# Altium footprint library Разъемы.PcbLib: 291 footprints (part 4 of 19)
Each footprint in its own frame and in the unit in brackets; x right, y up, seen from the top. Pads: shape width x height; smd on the part's side, far side on the other; paste and mask are expansions set on the pad; w line width, h text height; cw(c..) or ccw(c..) is an arc to the next point about the centre after c.
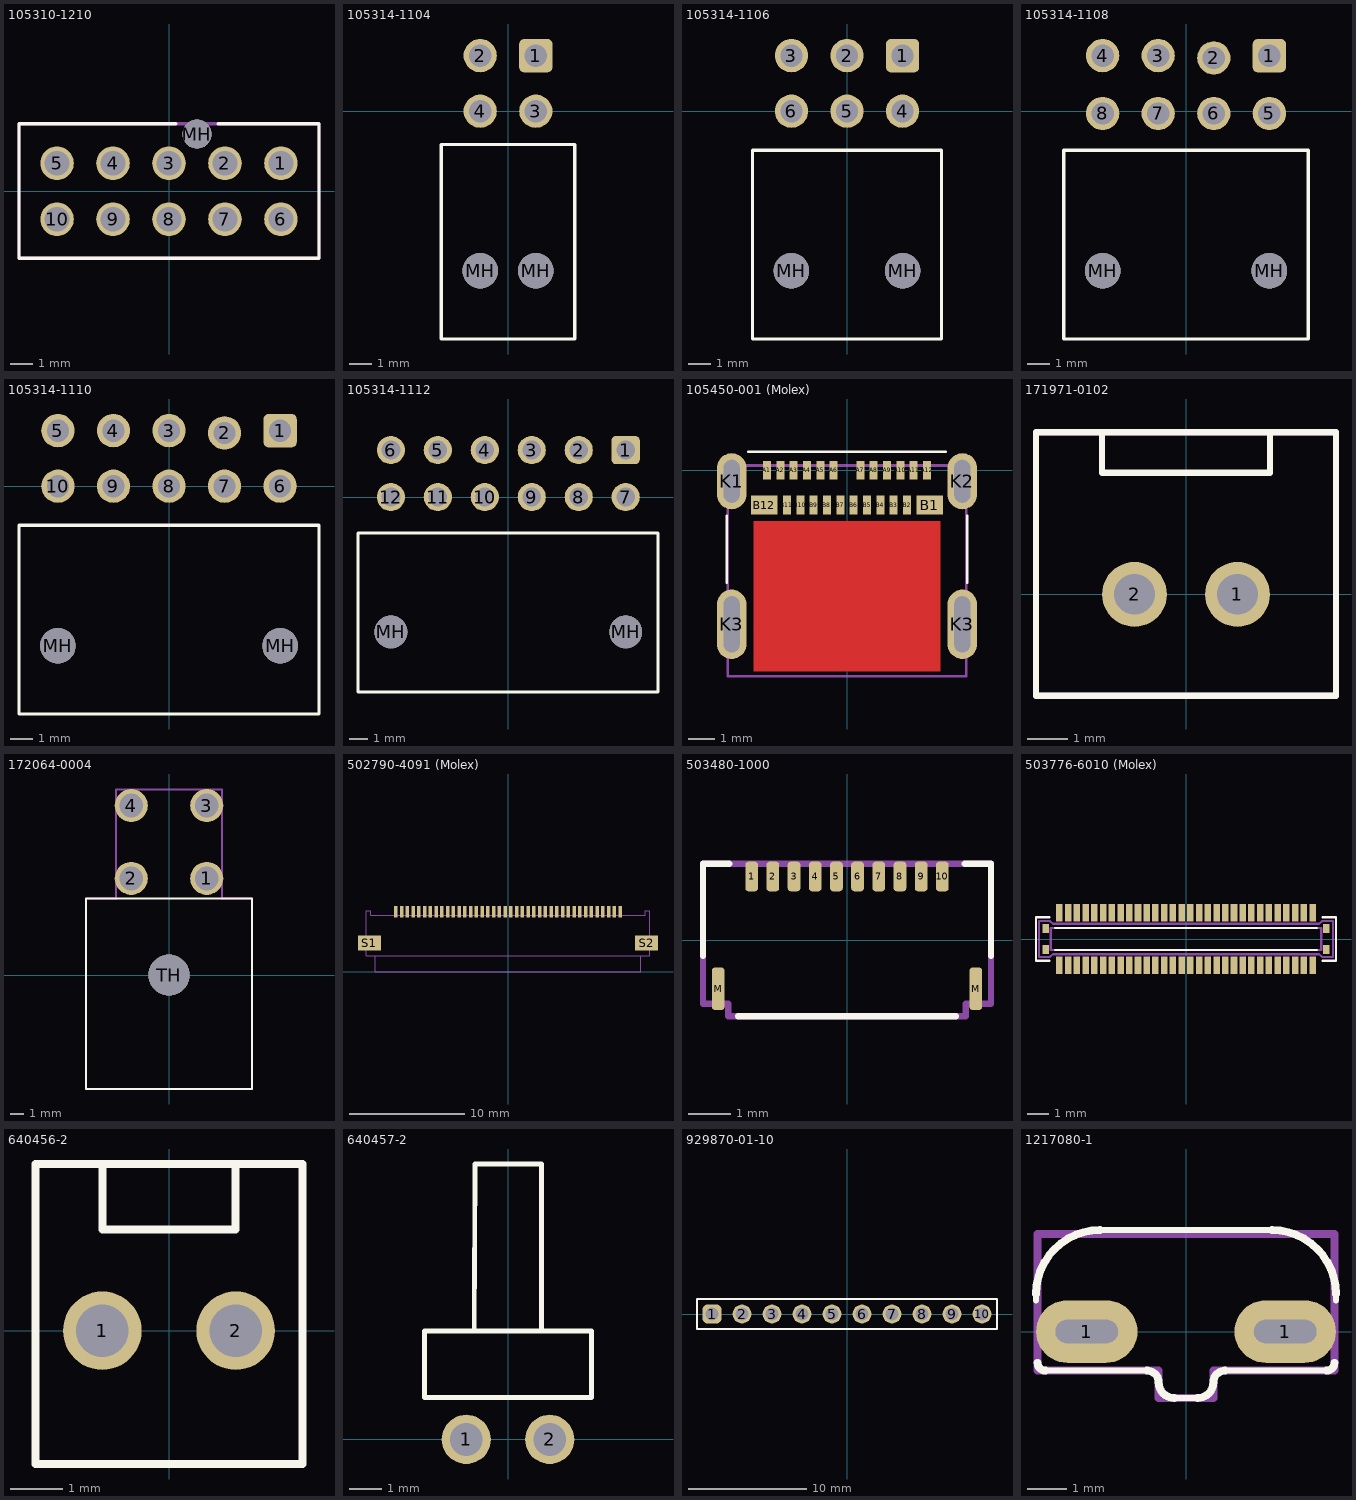
[diagram p3: the footprints below, top view; thin cyan lines are the x and y axes]

## 105310-1210 [mm]
pads (11):
  round 1.5 hole 1.1: 1(5,1.25) 2(2.5,1.25) 3(0,1.25) 4(-2.5,1.25) 5(-5,1.25) 6(5,-1.25) 7(2.5,-1.25) 8(0,-1.25) 9(-2.5,-1.25) 10(-5,-1.25)
  round 1.3 hole 1.3 unplated: MH(1.25,2.55)
Top Overlay:
  lines w0.15: 0.3,3.01 -6.7,3.01 -6.7,-3 6.7,-3 6.7,3.01 2.2,3.01
  text "." at 5.53,3.5 h0.1
Top Courtyard:
  lines w0.15: -6.7,-3 -6.7,3.01 6.7,3.01 6.7,-3 0,-3 -6.7,-3
Top Designator:
  text ".Designator" at -3.999,1.121 h0.8
3D body "1053101110.stp": height 10.68, standoff -3.03, extent -6.72,-2.99 6.72,5.85

## 105314-1104 [mm]
height 9.2
pads (6):
  rrect30% 1.5x1.5 hole 1: 1(1.25,2.5)
  round 1.5 hole 1: 2(-1.25,2.5) 3(1.25,0) 4(-1.25,0)
  round 1.6 hole 1.6 unplated: MH(-1.25,-7.18) MH(1.25,-7.18)
Top Overlay:
  lines w0.15: -3,-10.25 -3,-1.5 0,-1.5 3,-1.5 3,-10.25 -3,-10.25
  text "." at 2,3.75 h0.1
3D body "1053141104.stp": height 9.15, standoff -3.19, extent -2.97,-11.84 2.97,2.818

## 105314-1106 [mm]
height 9.2
pads (8):
  rrect30% 1.5x1.5 hole 1: 1(2.5,2.5)
  round 1.5 hole 1: 2(0,2.5) 3(-2.5,2.5) 4(2.5,0) 5(0,0) 6(-2.5,0)
  round 1.6 hole 1.6 unplated: MH(-2.5,-7.18) MH(2.5,-7.18)
Top Overlay:
  lines w0.15: -4.25,-10.25 4.25,-10.25 4.25,-1.75 -4.25,-1.75 -4.25,-10.25
  text "." at 3.75,3.75 h0.1
3D body "1053141406.stp": height 9.15, standoff -3.19, extent -4.22,-11.84 4.22,2.818

## 105314-1108 [mm]
height 9.2
pads (10):
  rrect30% 1.5x1.5 hole 1: 1(3.75,2.5)
  round 1.5 hole 1: 2(1.25,2.4) 3(-1.25,2.5) 4(-3.75,2.5) 5(3.75,-0.1) 6(1.25,-0.1) 7(-1.25,-0.1) 8(-3.75,-0.1)
  round 1.6 hole 1.6 unplated: MH(-3.75,-7.18) MH(3.75,-7.18)
Top Overlay:
  lines w0.15: -5.5,-10.25 5.5,-10.25 5.5,-1.75 -5.5,-1.75 -5.5,-10.25
  text "." at 5,3.5 h0.1
3D body "1053141108.stp": height 9.25, standoff -3.09, extent -5.47,-11.89 5.47,2.768

## 105314-1110 [mm]
height 9.2
pads (12):
  rrect30% 1.5x1.5 hole 1: 1(5,2.5)
  round 1.5 hole 1: 2(2.5,2.4) 3(0,2.5) 4(-2.5,2.5) 5(-5,2.5) 6(5,0) 7(2.5,0) 8(0,0) 9(-2.5,0) 10(-5,0)
  round 1.6 hole 1.6 unplated: MH(-5,-7.18) MH(5,-7.18)
Top Overlay:
  lines w0.15: -6.75,-10.25 -6.75,-1.75 6.75,-1.75 6.75,-10.25 -6.75,-10.25
  text "." at 6.25,3.5 h0.1
3D body "1053141110.stp": height 9.15, standoff -3.19, extent -6.72,-11.89 6.72,2.768

## 105314-1112 [mm]
pads (14):
  rrect30% 1.5x1.5 hole 1: 1(6.25,2.5)
  round 1.5 hole 1: 2(3.75,2.5) 3(1.25,2.5) 4(-1.25,2.5) 5(-3.75,2.5) 6(-6.25,2.5) 7(6.25,0) 8(3.75,0) 9(1.25,0) 10(-1.25,0) 11(-3.75,0) 12(-6.25,0)
  round 1.75 hole 1.75 unplated: MH(-6.25,-7.18) MH(6.25,-7.18)
Top Overlay:
  lines w0.15: -8,-10.38 7.97,-10.38 7.97,-1.92 -8,-1.92 -8,-10.38
  text "." at 7.5,3.5 h0.1
3D body "1053141112.stp": height 9.35, standoff -2.99, extent -7.97,-11.89 7.97,2.768

## 105450-001 (Molex) [mm] "Type-C"
height 2.56
pads (28):
  rect 0.3x0.7 smd: A1(-3,0) A2(-2.5,0) A3(-2,0) A4(-1.5,0) A5(-1,0) A6(-0.5,0) A7(0.5,0) A8(1,0) A9(1.5,0) A10(2,0) A11(2.5,0) A12(3,0) B2(2.25,-1.3) B3(1.75,-1.3) B4(1.25,-1.3) B5(0.75,-1.3) B6(0.25,-1.3) B7(-0.25,-1.3) B8(-0.75,-1.3) B9(-1.25,-1.3) B10(-1.75,-1.3) B11(-2.25,-1.3)
  rect 1x0.7 smd: B1(3.1,-1.3) B12(-3.1,-1.3)
  oval 1.1x2.1 hole 0.6 slot 1.6 at 90 deg: K1(-4.32,-0.41) K2(4.32,-0.41)
  oval 1.1x2.6 hole 0.6 slot 2.1 at 90 deg: K3(-4.32,-5.77) K3(4.32,-5.77)
Top Layer:
  rectangle: -3.5,-7.54 3.5,-1.89
Top Overlay:
  lines w0.1: -4.5,-4.2 -4.5,-1.7 ; -3.7,0.7 3.7,0.7 ; 4.5,-4.2 4.5,-1.7
Mechanical 1:
  lines w0.1: -4.47,-7.72 -4.47,0.18 4.47,0.18 4.47,-7.72 -4.47,-7.72
3D body "1054500 - 101 (Molex).STEP": height 3.17, standoff -0.79, extent -4.47,-7.72 4.47,0.18

## 171971-0102 [mm]
height 12
pads (2):
  round 1.6 hole 1: 1(1.27,0) 2(-1.27,0)
Top Overlay:
  lines w0.15: -1.011,4 -2.07,4 -2.07,3 0,3 2.07,3 2.07,4 ; -3.7,-2.5 -3.7,4 3.7,4 3.7,-2.5 -3.7,-2.5
  text "." at 1.5,-3 h0.1
Top Courtyard:
  lines w0.15: -3.7,-2.5 3.7,-2.5 3.7,4 -3.7,4 -3.7,-2.5
3D body "1719710002.stp": height 11.8, standoff -3.31, extent -3.69,-2.55 3.69,4.05

## 172064-0004 [mm] "172064-0004 & 76825-0004"
height 15
pads (5):
  round 2.5 hole 1.8: 1(2.85,7.3) 2(-2.85,7.3) 3(2.85,12.8) 4(-2.85,12.8)
  round 3.1 hole 3.1 unplated: TH(0,0)
Top Overlay:
  lines w0.15: -6.25,-8.6 6.25,-8.6 6.25,5.775 -0.575,5.775 -6.25,5.775 -6.25,-8.6
  text "." at 5,7.25 h0.1
Top Courtyard:
  lines w0.15: -6.25,-8.6 6.25,-8.6 6.25,5.775 4,5.775 4,14 -4,14 -4,5.775 -6.25,5.775 -6.25,-8.6
3D body "172064-0004.stp": height 14.62, standoff -3.52, extent -6.03,-8.587 6.03,13.375

## 502790-4091 (Molex) [mm] "502790-4091 (Molex)"
height 2.5
pads (42):
  rect 0.3x1 smd: 1(9.75,5.2) 2(9.25,5.2) 3(8.75,5.2) 4(8.25,5.2) 5(7.75,5.2) 6(7.25,5.2) 7(6.75,5.2) 8(6.25,5.2) 9(5.75,5.2) 10(5.25,5.2) 11(4.75,5.2) 12(4.25,5.2) 13(3.75,5.2) 14(3.25,5.2) 15(2.75,5.2) 16(2.25,5.2) 17(1.75,5.2) 18(1.25,5.2) 19(0.75,5.2) 20(0.25,5.2) 21(-0.25,5.2) 22(-0.75,5.2) 23(-1.25,5.2) 24(-1.75,5.2) 25(-2.25,5.2) 26(-2.75,5.2) 27(-3.25,5.2) 28(-3.75,5.2) 29(-4.25,5.2) 30(-4.75,5.2) 31(-5.25,5.2) 32(-5.75,5.2) 33(-6.25,5.2) 34(-6.75,5.2) 35(-7.25,5.2) 36(-7.75,5.2) 37(-8.25,5.2) 38(-8.75,5.2) 39(-9.25,5.2) 40(-9.75,5.2)
  rect 2x1.3 smd: S1(-12.05,2.5) S2(12.05,2.5)
Mechanical 1:
  rectangle: 12.35,2.05 12.75,2.95
  rectangle: -12.75,2.05 -12.35,2.95
  rectangle: 9.675,4.9 9.825,5.4
  rectangle: 9.175,4.9 9.325,5.4
  rectangle: 8.675,4.9 8.825,5.4
  rectangle: 8.175,4.9 8.325,5.4
  rectangle: 7.675,4.9 7.825,5.4
  rectangle: 7.175,4.9 7.325,5.4
  rectangle: 6.675,4.9 6.825,5.4
  rectangle: 6.175,4.9 6.325,5.4
  rectangle: 5.675,4.9 5.825,5.4
  rectangle: 5.175,4.9 5.325,5.4
  rectangle: 4.675,4.9 4.825,5.4
  rectangle: 4.175,4.9 4.325,5.4
  rectangle: 3.675,4.9 3.825,5.4
  rectangle: 3.175,4.9 3.325,5.4
  rectangle: 2.675,4.9 2.825,5.4
  rectangle: 2.175,4.9 2.325,5.4
  rectangle: 1.675,4.9 1.825,5.4
  rectangle: 1.175,4.9 1.325,5.4
  rectangle: 0.675,4.9 0.825,5.4
  rectangle: 0.175,4.9 0.325,5.4
  rectangle: -0.325,4.9 -0.175,5.4
  rectangle: -0.825,4.9 -0.675,5.4
  rectangle: -1.325,4.9 -1.175,5.4
  rectangle: -1.825,4.9 -1.675,5.4
  rectangle: -2.325,4.9 -2.175,5.4
  rectangle: -2.825,4.9 -2.675,5.4
  rectangle: -3.325,4.9 -3.175,5.4
  rectangle: -3.825,4.9 -3.675,5.4
  rectangle: -4.325,4.9 -4.175,5.4
  rectangle: -4.825,4.9 -4.675,5.4
  rectangle: -5.325,4.9 -5.175,5.4
  rectangle: -5.825,4.9 -5.675,5.4
  rectangle: -6.325,4.9 -6.175,5.4
  rectangle: -6.825,4.9 -6.675,5.4
  rectangle: -7.325,4.9 -7.175,5.4
  rectangle: -7.825,4.9 -7.675,5.4
  rectangle: -8.325,4.9 -8.175,5.4
  rectangle: -8.825,4.9 -8.675,5.4
  rectangle: -9.325,4.9 -9.175,5.4
  rectangle: -9.825,4.9 -9.675,5.4
  lines w0.1: -11.55,1.4 -11.55,0 11.55,0 11.55,1.4 ; -12.35,1.4 12.35,1.4 12.35,5.3 11.95,5.3 11.95,4.9 -11.95,4.9 -11.95,5.3 -12.35,5.3 -12.35,1.4
3D body "502790-4091 (Molex).STEP": height 2.5, standoff 0, extent -12.75,-0.15 12.75,5.25

## 503480-1000 [mm]
height 1
pads (12):
  rrect50% 0.3x0.7 smd: 1(-2.25,1.5) 2(-1.75,1.5) 3(-1.25,1.5) 4(-0.75,1.5) 5(-0.25,1.5) 6(0.25,1.5) 7(0.75,1.5) 8(1.25,1.5) 9(1.75,1.5) 10(2.25,1.5)
  rrect50% 0.3x1 smd: M(-3.04,-1.15) M(3.04,-1.15)
Top Overlay:
  lines w0.15: -3.4,-0.375 -3.4,1.8 -2.776,1.8 ; -2.574,-1.801 0,-1.801 2.574,-1.801 ; 2.776,1.8 3.4,1.8 3.4,-0.375
  text "." at -2.75,2.25 h0.1
Top Courtyard:
  lines w0.15: -3.4,-1.5 -2.8,-1.5 -2.8,-1.8 2.8,-1.8 2.8,-1.5 3.4,-1.5 3.4,1.8 -3.4,1.8 -3.4,-1.5
3D body "5034801000.stp": height 1.88, standoff -0.02, extent -3.35,-1.82 3.35,1.78

## 503776-6010 (Molex) [mm] "503776-6010 (Molex)"
height 0.68
pads (64):
  rect 0.3x0.8 smd: 1(-5.8,1.2) 2(-5.8,-1.2) 3(-5.4,1.2) 4(-5.4,-1.2) 5(-5,1.2) 6(-5,-1.2) 7(-4.6,1.2) 8(-4.6,-1.2) 9(-4.2,1.2) 10(-4.2,-1.2) 11(-3.8,1.2) 12(-3.8,-1.2) 13(-3.4,1.2) 14(-3.4,-1.2) 15(-3,1.2) 16(-3,-1.2) 17(-2.6,1.2) 18(-2.6,-1.2) 19(-2.2,1.2) 20(-2.2,-1.2) 21(-1.8,1.2) 22(-1.8,-1.2) 23(-1.4,1.2) 24(-1.4,-1.2) 25(-1,1.2) 26(-1,-1.2) 27(-0.6,1.2) 28(-0.6,-1.2) 29(-0.2,1.2) 30(-0.2,-1.2) 31(0.2,1.2) 32(0.2,-1.2) 33(0.6,1.2) 34(0.6,-1.2) 35(1,1.2) 36(1,-1.2) 37(1.4,1.2) 38(1.4,-1.2) 39(1.8,1.2) 40(1.8,-1.2) 41(2.2,1.2) 42(2.2,-1.2) 43(2.6,1.2) 44(2.6,-1.2) 45(3,1.2) 46(3,-1.2) 47(3.4,1.2) 48(3.4,-1.2) 49(3.8,1.2) 50(3.8,-1.2) 51(4.2,1.2) 52(4.2,-1.2) 53(4.6,1.2) 54(4.6,-1.2) 55(5,1.2) 56(5,-1.2) 57(5.4,1.2) 58(5.4,-1.2) 59(5.8,1.2) 60(5.8,-1.2)
  rect 0.3x0.42 smd: Fitting1(-6.43,0.48) Fitting2(-6.43,-0.48) Fitting3(6.43,0.48) Fitting4(6.43,-0.48)
Top Overlay:
  lines w0.1: -6.25,-1 -6.875,-1 -6.875,1 -6.25,1 ; -6,-0.5 6,-0.5 ; -6,0.5 6,0.5 ; 6.25,-1 6.875,-1 6.875,1 6.25,1
Mechanical 1:
  lines w0.1: -6.74,-0.82 -6.24,-0.82 -6.1,-0.7 6.1,-0.7 6.24,-0.82 6.74,-0.82 6.74,0.82 6.24,0.82 6.1,0.7 -6.1,0.7 -6.24,0.82 -6.74,0.82 -6.74,-0.82 ; -6.2,-0.5 6.2,-0.5 6.2,0.5 -6.2,0.5 -6.2,-0.5
3D body "503776-6010 (Molex).STEP": height 0.68, standoff 0, extent -6.735,-1.05 6.735,1.05

## 640456-2 [mm]
pads (2):
  round 1.5 hole 1: 1(-1.27,0) 2(1.27,0)
Top Overlay:
  lines w0.15: -1.27,3.175 -1.27,1.93 1.27,1.93 1.27,3.175 ; -2.54,-2.54 2.54,-2.54 2.54,3.175 -2.54,3.175 -2.54,-2.54
  text "." at -1.5,-3.25 h0.1
3D body "User Library-640456-2.step": height 10.03, standoff -3.56, extent -2.54,-2.667 2.54,3.175

## 640457-2 [mm]
pads (2):
  round 1.5 hole 1: 1(-1.27,0) 2(1.27,0)
Top Overlay:
  lines w0.15: -1.026,3.302 -1.008,8.382 1.016,8.382 1.016,3.302 ; -2.54,1.27 2.54,1.27 2.54,3.302 -2.54,3.302 -2.54,1.27
  text "." at -2.25,-1 h0.1
3D body: height 3.43, standoff -3, extent -1.524,-0.254 -1.016,0.254
3D body: height 3.43, standoff -3, extent 1.016,-0.254 1.524,0.254
3D body: height 3.43, standoff 2.92, extent 1.016,-0.254 1.524,10.922
3D body: height 3.43, standoff 2.92, extent -1.524,-0.254 -1.016,10.922
3D body: height 5.71, standoff 4.57, extent -1.016,3.302 1.016,8.382
3D body: height 5.71, standoff 0, extent -2.54,1.27 2.54,3.302

## 929870-01-10 [mm]
height 3.81
pads (10):
  rrect50% 1.6x1.6 hole 1.1: 1(-11.43,0)
  round 1.6 hole 1.1: 2(-8.89,0) 3(-6.35,0) 4(-3.81,0) 5(-1.27,0) 6(1.27,0) 7(3.81,0) 8(6.35,0) 9(8.89,0) 10(11.43,0)
Top Overlay:
  lines w0.15: -12.7,-1.27 -12.7,1.27 12.7,1.27 12.7,-1.27 -12.7,-1.27
  text "." at -11.5,-2 h0.1
3D body: height 3.81, standoff 0, extent -12.7,-1.27 12.7,1.27

## 1217080-1 [mm]
pads (2):
  oval 2.6x1.6 hole 0.6 slot 1.6 at 0 deg: 1(-2.54,0) 1(2.54,0)
Top Overlay:
  lines w0.15: -3.84,0.8 -3.84,0.96 ; -3.6,-1 -1.24,-1 -1,-1 ; -2.2,2.6 0.1,2.6 ; -0.3,-1.7 0,-1.7 0.3,-1.7 ; -0.1,2.6 2.2,2.6 ; 1,-1 1.24,-1 3.6,-1 ; 3.84,0.8 3.84,0.96
  lines w0.2: -3.84,0.96 cw(c-2.2,0.96) -2.2,2.6 ; -3.8,-0.8 ccw(c-3.6,-0.8) -3.6,-1 ; -1,-1 cw(c-1,-1.3) -0.7,-1.3 ccw(c-0.3,-1.3) -0.3,-1.7 ; 0.3,-1.7 ccw(c0.3,-1.3) 0.7,-1.3 cw(c1,-1.3) 1,-1 ; 2.2,2.6 cw(c2.2,0.96) 3.84,0.96 ; 3.6,-1 ccw(c3.6,-0.8) 3.8,-0.8
Top Courtyard:
  lines w0.2: -3.8,-1 -3.8,2.5 0,2.5 3.8,2.5 3.8,-1 0.7,-1 0.7,-1.7 0,-1.7 -0.7,-1.7 -0.7,-1 -3.8,-1
3D body "1217080-1.stp": height 9.91, standoff -3.81, extent -3.699,-1.675 3.794,2.567